# Altium footprint library avalon_all_V1.PcbLib: 81 footprints (part 4 of 6)
Each footprint in its own frame and in the unit in brackets; x right, y up, seen from the top. Pads: shape width x height; smd on the part's side, far side on the other; paste and mask are expansions set on the pad; w line width, h text height; cw(c..) or ccw(c..) is an arc to the next point about the centre after c.
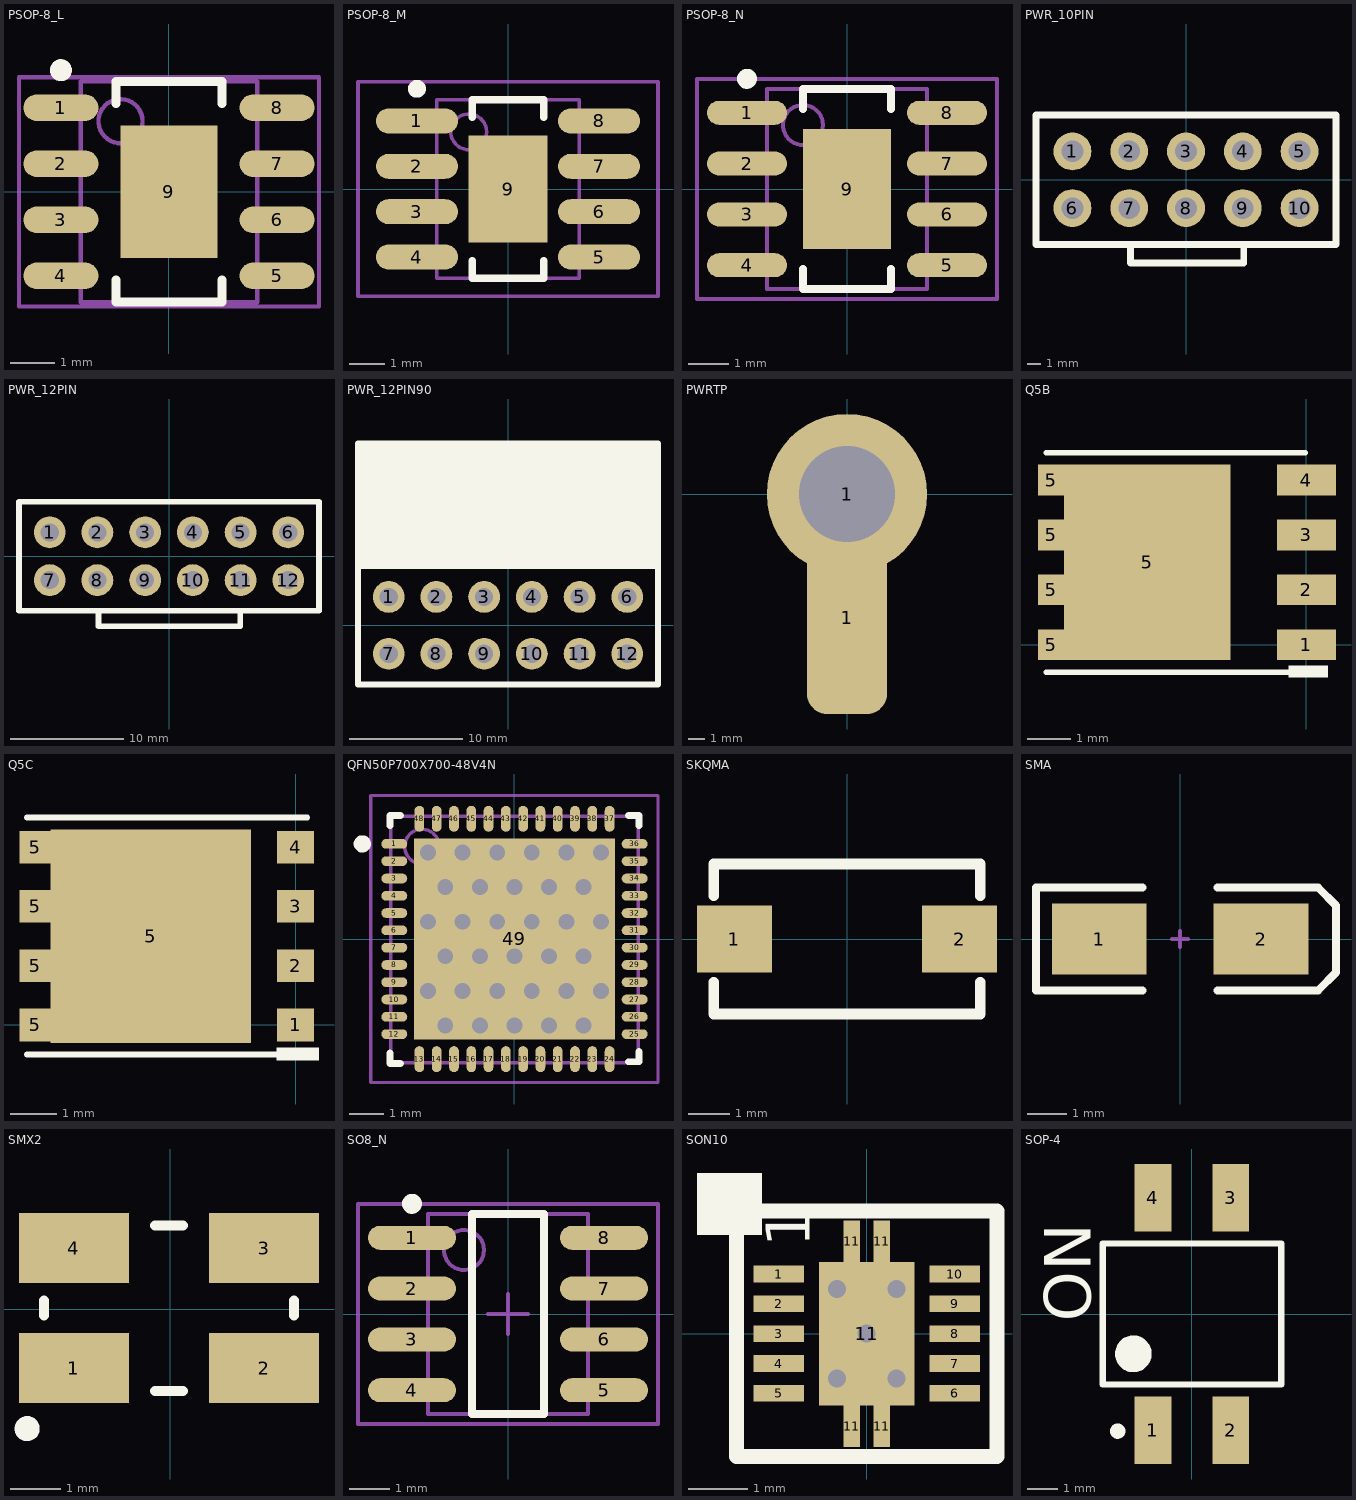
[diagram p3: the footprints below, top view; thin cyan lines are the x and y axes]

## PSOP-8_L [mm] "8-Pin Small Outline Integrated Circuit 1.27 mm Pitch, IPC High Density"
height 1.55
pads (9):
  oval 1.7x0.6 smd: 1(-2.45,1.905) 2(-2.45,0.635) 3(-2.45,-0.635) 4(-2.45,-1.905) 5(2.45,-1.905) 6(2.45,-0.635) 7(2.45,0.635) 8(2.45,1.905)
  rect 2.2x3 smd: 9(0,0)
Top Overlay:
  circle w0.25: c-2.45,2.755 r0.125
  lines w0.2: -1.2,-2 -1.2,-2.5 1.2,-2.5 1.2,-2 ; -1.2,2 -1.2,2.5 1.2,2.5 1.2,2
Mechanical 13:
  circle w0.1: c-1.1,1.6 r0.5
  lines w0.1: -2,-2.5 2,-2.5 2,2.5 -2,2.5 -2,-2.5
Mechanical 15:
  lines w0.1: -0.5,0 0.5,0 ; 0,-0.5 0,0.5 ; -3.4,-2.6 3.4,-2.6 3.4,2.6 -3.4,2.6 -3.4,-2.6
3D body: height 1.55, standoff 0, extent -2,-2.5 2,2.5

## PSOP-8_M [mm] "8-Pin Small Outline Integrated Circuit 1.27 mm Pitch, IPC Low Density"
height 1.55
pads (9):
  oval 2.3x0.7 smd: 1(-2.55,1.905) 2(-2.55,0.635) 3(-2.55,-0.635) 4(-2.55,-1.905) 5(2.55,-1.905) 6(2.55,-0.635) 7(2.55,0.635) 8(2.55,1.905)
  rect 2.2x3 smd: 9(0,0)
Top Overlay:
  circle w0.25: c-2.55,2.805 r0.125
  lines w0.2: -1,-2 -1,-2.5 1,-2.5 1,-2 ; -1,2 -1,2.5 1,2.5 1,2
Mechanical 13:
  circle w0.1: c-1.1,1.6 r0.5
  lines w0.1: -2,-2.5 2,-2.5 2,2.5 -2,2.5 -2,-2.5
Mechanical 15:
  lines w0.1: -0.5,0 0.5,0 ; 0,-0.5 0,0.5 ; -4.2,-3 4.2,-3 4.2,3 -4.2,3 -4.2,-3
3D body: height 1.55, standoff 0, extent -2,-2.5 2,2.5

## PSOP-8_N [mm] "8-Pin Small Outline Integrated Circuit 1.27 mm Pitch, IPC Medium Density"
height 1.55
pads (9):
  oval 2x0.6 smd: 1(-2.5,1.905) 2(-2.5,0.635) 3(-2.5,-0.635) 4(-2.5,-1.905) 5(2.5,-1.905) 6(2.5,-0.635) 7(2.5,0.635) 8(2.5,1.905)
  rect 2.2x3 smd: 9(0,0)
Top Overlay:
  circle w0.25: c-2.5,2.755 r0.125
  lines w0.2: -1.1,-2 -1.1,-2.5 1.1,-2.5 1.1,-2 ; -1.1,2 -1.1,2.5 1.1,2.5 1.1,2
Mechanical 13:
  circle w0.1: c-1.1,1.6 r0.5
  lines w0.1: -2,-2.5 -2,2.5 2,2.5 2,-2.5 -2,-2.5
Mechanical 15:
  lines w0.1: -0.5,0 0.5,0 ; 0,-0.5 0,0.5 ; -3.75,-2.75 -3.75,2.75 3.75,2.75 3.75,-2.75 -3.75,-2.75
3D body: height 1.55, standoff 0, extent -2,-2.5 2,2.5

## PWR_10PIN [mm]
pads (10):
  round 2.8 hole 1.6: 1(-8.402,2.1) 2(-4.202,2.1) 3(-0.002,2.1) 4(4.198,2.1) 5(8.398,2.1) 6(-8.402,-2.1) 7(-4.202,-2.1) 8(-0.002,-2.1) 9(4.198,-2.1) 10(8.398,-2.1)
Top Overlay:
  lines w0.508: -4.1,-5.029 -4.1,-6.172 4.267,-6.172 4.267,-5.105 ; -11.102,-4.8 -11.102,4.801 11.098,4.8 11.098,-4.801 -11.102,-4.8
3D body: height 13, standoff 0, extent -11.102,-4.8 11.098,4.8

## PWR_12PIN [mm]
pads (12):
  round 2.8 hole 1.6: 1(-10.5,2.1) 2(-6.3,2.1) 3(-2.1,2.1) 4(2.1,2.1) 5(6.3,2.1) 6(10.5,2.1) 7(-10.5,-2.1) 8(-6.3,-2.1) 9(-2.1,-2.1) 10(2.1,-2.1) 11(6.3,-2.1) 12(10.5,-2.1)
Top Overlay:
  lines w0.508: -6.198,-5.029 -6.198,-6.172 6.274,-6.172 6.274,-5.105 ; -13.2,-4.8 13.2,-4.8 13.2,4.8 -13.2,4.8 -13.2,-4.8
3D body: height 13, standoff 0, extent -13.199,-4.799 13.199,4.799

## PWR_12PIN90 [mm]
pads (12):
  round 2.8 hole 1.6: 1(-10.5,2.5) 2(-6.3,2.5) 3(-2.1,2.5) 4(2.1,2.5) 5(6.3,2.5) 6(10.5,2.5) 7(-10.5,-2.5) 8(-6.3,-2.5) 9(-2.1,-2.5) 10(2.1,-2.5) 11(6.3,-2.5) 12(10.5,-2.5)
Top Overlay:
  rectangle: -13.2,5.2 13.2,16
  lines w0.508: -13.2,5.2 13.2,5.2 ; -13.2,-5.2 -13.2,16 13.2,16 13.2,-5.2 -13.2,-5.2
3D body: height 13, standoff 0, extent -13.2,-4.799 13.2,16

## PWRTP [mm]
height 2.54
pads (2):
  rrect50% 5x12 smd: 1(0,-7.714)
  round 10 hole 6: 1(0,0)
3D body: height 2.54, standoff 0, extent -5.102,-5.102 5.102,5.102

## Q5B [mil] "Q5C Package Recommended PCB Pattern"
height 39.37
pads (9):
  rect 54x28 smd: 1(0,0) 2(0,50) 3(0,100) 4(0,150)
  rect 24x28 smd: 5(-232.44,0) 5(-232.44,50) 5(-232.44,100) 5(-232.44,150)
  rect 152x178 smd: 5(-145.05,75)
Top Overlay:
  rectangle: -16.22,-30 19.78,-19
  lines w5: -237.33,-25 -1.11,-25 ; -237.33,175 -1.11,175

## Q5C [mm] "Q5C Package Recommended PCB Pattern"
height 1
pads (9):
  rect 0.8x0.7 smd: 1(0,0) 2(0,1.27) 3(0,2.54) 4(0,3.81)
  rect 0.68x0.7 smd: 5(-5.574,0) 5(-5.574,1.27) 5(-5.574,2.54) 5(-5.574,3.81)
  rect 4.29x4.572 smd: 5(-3.1,1.905)
Top Overlay:
  rectangle: -0.412,-0.762 0.502,-0.483
  lines w0.127: -5.749,-0.635 0.251,-0.635 ; -5.749,4.445 0.251,4.445

## QFN50P700X700-48V4N [mm] "QFN, 48-Leads, Body 7x7mm, Pitch 0.5mm, IPC Medium Density"
height 1
pads (49):
  oval 0.75x0.28 smd mask+0.075: 1(-3.475,2.75) 2(-3.475,2.25) 3(-3.475,1.75) 4(-3.475,1.25) 5(-3.475,0.75) 6(-3.475,0.25) 7(-3.475,-0.25) 8(-3.475,-0.75) 9(-3.475,-1.25) 10(-3.475,-1.75) 11(-3.475,-2.25) 12(-3.475,-2.75) 25(3.475,-2.75) 26(3.475,-2.25) 27(3.475,-1.75) 28(3.475,-1.25) 29(3.475,-0.75) 30(3.475,-0.25) 31(3.475,0.25) 32(3.475,0.75) 33(3.475,1.25) 34(3.475,1.75) 35(3.475,2.25) 36(3.475,2.75)
  oval 0.28x0.75 smd mask+0.075: 13(-2.75,-3.475) 14(-2.25,-3.475) 15(-1.75,-3.475) 16(-1.25,-3.475) 17(-0.75,-3.475) 18(-0.25,-3.475) 19(0.25,-3.475) 20(0.75,-3.475) 21(1.25,-3.475) 22(1.75,-3.475) 23(2.25,-3.475) 24(2.75,-3.475) 37(2.75,3.475) 38(2.25,3.475) 39(1.75,3.475) 40(1.25,3.475) 41(0.75,3.475) 42(0.25,3.475) 43(-0.25,3.475) 44(-0.75,3.475) 45(-1.25,3.475) 46(-1.75,3.475) 47(-2.25,3.475) 48(-2.75,3.475)
  rect 5.8x5.8 smd paste-0.2 mask-0.15: 49(0,0)
via -0.5,0.5 diameter 0.813 hole 0.457
via 0.5,0.5 diameter 0.813 hole 0.457
via 1.5,0.5 diameter 0.813 hole 0.457
via 2.5,0.5 diameter 0.813 hole 0.457
via -1.5,0.5 diameter 0.813 hole 0.457
via -2.5,0.5 diameter 0.813 hole 0.457
via -2,-0.5 diameter 0.813 hole 0.457
via -1,-0.5 diameter 0.813 hole 0.457
via 0,-0.5 diameter 0.813 hole 0.457
via 1,-0.5 diameter 0.813 hole 0.457
via 2,-0.5 diameter 0.813 hole 0.457
via -2.5,-1.5 diameter 0.813 hole 0.457
via -1.5,-1.5 diameter 0.813 hole 0.457
via -0.5,-1.5 diameter 0.813 hole 0.457
via 0.5,-1.5 diameter 0.813 hole 0.457
via 1.5,-1.5 diameter 0.813 hole 0.457
via 2.5,-1.5 diameter 0.813 hole 0.457
via 2,1.5 diameter 0.813 hole 0.457
via 1,1.5 diameter 0.813 hole 0.457
via 0,1.5 diameter 0.813 hole 0.457
via -1,1.5 diameter 0.813 hole 0.457
via -2,1.5 diameter 0.813 hole 0.457
via -2.5,2.5 diameter 0.813 hole 0.457
via -1.5,2.5 diameter 0.813 hole 0.457
via -0.5,2.5 diameter 0.813 hole 0.457
via 0.5,2.5 diameter 0.813 hole 0.457
via 2.5,2.5 diameter 0.813 hole 0.457
via -2,-2.5 diameter 0.813 hole 0.457
via -1,-2.5 diameter 0.813 hole 0.457
via 0,-2.5 diameter 0.813 hole 0.457
via 1,-2.5 diameter 0.813 hole 0.457
via 2,-2.5 diameter 0.813 hole 0.457
via 1.5,2.5 diameter 0.813 hole 0.457
Top Overlay:
  circle w0.25: c-4.4,2.75 r0.125
  lines w0.2: -3.6,-3.3 -3.6,-3.6 -3.3,-3.6 ; -3.6,3.275 -3.6,3.575 -3.3,3.575 ; 3.3,-3.55 3.6,-3.55 3.6,-3.25 ; 3.3,3.575 3.6,3.575 3.6,3.275
Mechanical 13:
  circle w0.1: c-2.675,2.675 r0.5
  lines w0.1: -3.575,3.55 3.575,3.55 ; -3.575,3.575 -3.575,-3.575 3.575,-3.575 3.575,3.575
Mechanical 15:
  lines w0.1: -0.5,0 0.5,0 ; 0,-0.5 0,0.5 ; -4.15,-4.15 4.15,-4.15 4.15,4.15 -4.15,4.15 -4.15,-4.15

## SKQMA [mm]
height 5
pads (2):
  rect 1.8x1.6 smd: 1(-2.7,0) 2(2.7,0)
Top Overlay:
  lines w0.254: -3.2,-1.041 -3.2,-1.8 3.2,-1.8 3.2,-1.041 ; -3.2,1.041 -3.2,1.8 3.2,1.8 3.2,1.041

## SMA [mm] "DO-214-AC/SMA; 2 C-Bend Leads; Body 5 x 2.7 mm, inc. leads (LxW)"
height 2.44
pads (2):
  rect 2.4x1.8 smd: 1(-2.05,0) 2(2.05,0)
Top Overlay:
  lines w0.2: -0.95,-1.3 -3.65,-1.3 -3.65,1.3 -0.95,1.3 ; 0.95,-1.3 3.5,-1.3 3.95,-0.85 3.95,0.85 3.5,1.3 0.95,1.3
Mechanical 1:
  lines w0.1: -0.2,0 0.2,0 ; 0,-0.2 0,0.2
3D body: height 2.44, standoff 0, extent -3.352,-1.002 3.352,1.002

## SMX2 [mm]
pads (4):
  rect 2.2x1.4 smd: 1(-1.925,-1.175) 2(1.875,-1.175) 3(1.875,1.225) 4(-1.925,1.225)
Top Overlay:
  circle w0.25: c-2.862,-2.384 r0.125
  lines w0.2: -2.525,-0.125 -2.525,0.175 ; -0.304,-1.628 0.254,-1.628 ; -0.304,1.678 0.254,1.678 ; 2.475,-0.125 2.475,0.175
3D body: height 1, standoff 0, extent -2.87,-1.727 2.819,1.778

## SO8_N [mm] "SOIC, 8-Leads, Body 4.9x3.9mm, Pitch 1.27mm, IPC Medium Density"
height 1.75
pads (8):
  oval 2.2x0.6 smd: 1(-2.4,1.905) 2(-2.4,0.635) 3(-2.4,-0.635) 4(-2.4,-1.905) 5(2.4,-1.905) 6(2.4,-0.635) 7(2.4,0.635) 8(2.4,1.905)
Top Overlay:
  circle w0.25: c-2.4,2.755 r0.125
  lines w0.2: -0.9,-2.5 0.9,-2.5 0.9,2.5 -0.9,2.5 -0.9,-2.5
Mechanical 13:
  circle w0.1: c-1.1,1.6 r0.5
  lines w0.1: -2,-2.5 2,-2.5 2,2.5 -2,2.5 -2,-2.5
Mechanical 15:
  lines w0.1: -0.5,0 0.5,0 ; 0,-0.5 0,0.5 ; -3.75,-2.75 3.75,-2.75 3.75,2.75 -3.75,2.75 -3.75,-2.75
3D body: height 1.75, standoff 0, extent -2,-2.5 2,2.5

## SON10 [mm]
pads (15):
  rect 0.85x0.28 smd paste+0.07 mask+0.07: 1(-1.475,1) 2(-1.475,0.5) 3(-1.475,0) 4(-1.475,-0.5) 5(-1.475,-1) 6(1.475,-1) 7(1.475,-0.5) 8(1.475,0) 9(1.475,0.5) 10(1.475,1)
  rect 0.28x0.7 smd paste+0 mask+0: 11(-0.25,-1.549) 11(-0.25,1.549) 11(0.25,-1.549) 11(0.25,1.549)
  rect 1.6x2.4 smd paste+0 mask+0: 11(0,0)
via 0.5,0.75 diameter 0.6 hole 0.3
via -0.5,0.75 diameter 0.6 hole 0.3
via 0.5,-0.75 diameter 0.6 hole 0.3
via -0.5,-0.75 diameter 0.6 hole 0.3
via 0,0 diameter 0.6 hole 0.3
Top Overlay:
  rectangle: -2.845,1.651 -1.753,2.692
  lines w0.254: -2.184,-2.057 2.184,-2.057 2.184,2.057 -2.184,2.057 -2.184,-2.057
  text "1" at -0.711,1.448 h1.27
3D body: height 0.8, standoff 0, extent -1.97,-1.899 1.97,1.899

## SOP-4 [mm]
pads (4):
  rect 1.2x2.2 smd: 1(-1.27,-3.8) 2(1.27,-3.8) 3(1.27,3.8) 4(-1.27,3.8)
Top Overlay:
  circle w0.6: c-1.91,-1.3 r0.3
  circle w0.25: c-2.42,-3.827 r0.125
  lines w0.2: -2.91,-2.3 2.921,-2.3 2.921,2.3 -2.91,2.3 -2.91,-2.3
  text "ON" at -3.302,-0.254 h1.52
3D body: height 0, standoff 0, extent -2.909,-2.299 2.92,2.299
3D body: height 0, standoff 0, extent -1.972,-5.002 1.972,5.002